# Altium footprint library cool_library.PcbLib: 1182 footprints (part 39 of 75)
Each footprint in its own frame and in the unit in brackets; x right, y up, seen from the top. Pads: shape width x height; smd on the part's side, far side on the other; paste and mask are expansions set on the pad; w line width, h text height; cw(c..) or ccw(c..) is an arc to the next point about the centre after c.
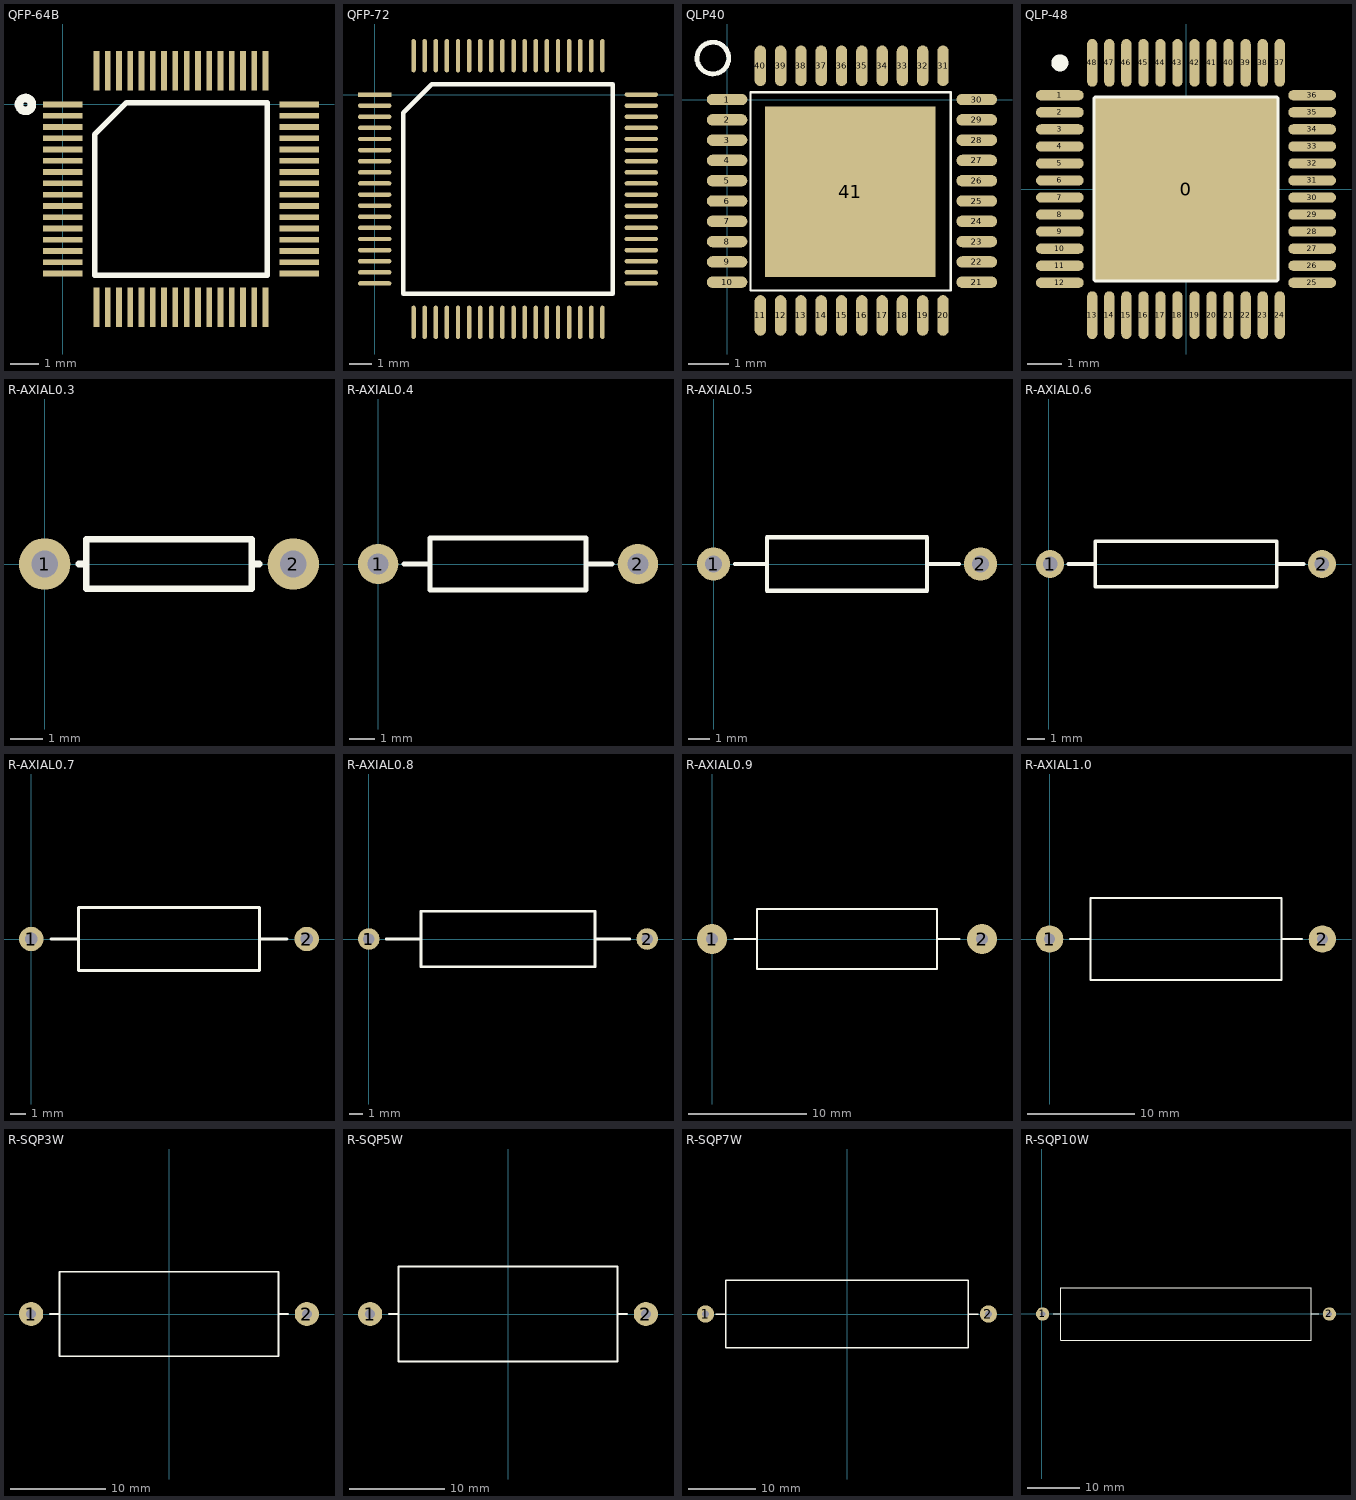
[diagram p38: the footprints below, top view; thin cyan lines are the x and y axes]

## QFP-64B [mil]
pads (64):
  rect 55x8 smd: 1(0,0) 2(0,-15.75) 3(0,-31.5) 4(0,-47.24) 5(0,-62.99) 6(0,-78.74) 7(0,-94.49) 8(0,-110.24) 9(0,-125.98) 10(0,-141.73) 11(0,-157.48) 12(0,-173.23) 13(0,-188.98) 14(0,-204.72) 15(0,-220.47) 16(0,-236.22) 33(330.71,-236.22) 34(330.71,-220.47) 35(330.71,-204.72) 36(330.71,-188.98) 37(330.71,-173.23) 38(330.71,-157.48) 39(330.71,-141.73) 40(330.71,-125.98) 41(330.71,-110.24) 42(330.71,-94.49) 43(330.71,-78.74) 44(330.71,-62.99) 45(330.71,-47.24) 46(330.71,-31.5) 47(330.71,-15.75) 48(330.71,0)
  rect 8x55 smd: 17(47.24,-283.46) 18(62.99,-283.46) 19(78.74,-283.46) 20(94.49,-283.46) 21(110.24,-283.46) 22(125.98,-283.46) 23(141.73,-283.46) 24(157.48,-283.46) 25(173.23,-283.46) 26(188.98,-283.46) 27(204.72,-283.46) 28(220.47,-283.46) 29(236.22,-283.46) 30(251.97,-283.46) 31(267.72,-283.46) 32(283.46,-283.46) 49(283.46,47.24) 50(267.72,47.24) 51(251.97,47.24) 52(236.22,47.24) 53(220.47,47.24) 54(204.72,47.24) 55(188.98,47.24) 56(173.23,47.24) 57(157.48,47.24) 58(141.73,47.24) 59(125.98,47.24) 60(110.24,47.24) 61(94.49,47.24) 62(78.74,47.24) 63(62.99,47.24) 64(47.24,47.24)
Top Overlay:
  circle w12: c-52.02,0 r9.02
  lines w7.87: 44.69,-238.78 44.69,-42.13 89.37,2.56 286.02,2.56 286.02,-238.78 44.69,-238.78

## QFP-72 [mm]
pads (72):
  rect 1.5x0.2 smd: 1(0,0)
  oval 1.5x0.2 smd: 2(0,-0.5) 3(0,-1) 4(0,-1.5) 5(0,-2) 6(0,-2.5) 7(0,-3) 8(0,-3.5) 9(0,-4) 10(0,-4.5) 11(0,-5) 12(0,-5.5) 13(0,-6) 14(0,-6.5) 15(0,-7) 16(0,-7.5) 17(0,-8) 18(0,-8.5) 37(12,-8.5) 38(12,-8) 39(12,-7.5) 40(12,-7) 41(12,-6.5) 42(12,-6) 43(12,-5.5) 44(12,-5) 45(12,-4.5) 46(12,-4) 47(12,-3.5) 48(12,-3) 49(12,-2.5) 50(12,-2) 51(12,-1.5) 52(12,-1) 53(12,-0.5) 54(12,0)
  oval 0.2x1.5 smd: 19(1.75,-10.25) 20(2.25,-10.25) 21(2.75,-10.25) 22(3.25,-10.25) 23(3.75,-10.25) 24(4.25,-10.25) 25(4.75,-10.25) 26(5.25,-10.25) 27(5.75,-10.25) 28(6.25,-10.25) 29(6.75,-10.25) 30(7.25,-10.25) 31(7.75,-10.25) 32(8.25,-10.25) 33(8.75,-10.25) 34(9.25,-10.25) 35(9.75,-10.25) 36(10.25,-10.25) 55(10.25,1.75) 56(9.75,1.75) 57(9.25,1.75) 58(8.75,1.75) 59(8.25,1.75) 60(7.75,1.75) 61(7.25,1.75) 62(6.75,1.75) 63(6.25,1.75) 64(5.75,1.75) 65(5.25,1.75) 66(4.75,1.75) 67(4.25,1.75) 68(3.75,1.75) 69(3.25,1.75) 70(2.75,1.75) 71(2.25,1.75) 72(1.75,1.75)
Top Overlay:
  lines w0.2: 1.285,-8.965 1.285,-0.82 2.57,0.465 10.715,0.465 10.715,-8.965 1.285,-8.965

## QLP40 [mm]
pads (41):
  oval 1x0.28 smd: 1(0,0) 2(0,-0.5) 3(0,-1) 4(0,-1.5) 5(0,-2) 6(0,-2.5) 7(0,-3) 8(0,-3.5) 9(0,-4) 10(0,-4.5) 21(6.15,-4.5) 22(6.15,-4) 23(6.15,-3.5) 24(6.15,-3) 25(6.15,-2.5) 26(6.15,-2) 27(6.15,-1.5) 28(6.15,-1) 29(6.15,-0.5) 30(6.15,0)
  oval 0.28x1 smd: 11(0.82,-5.32) 12(1.32,-5.32) 13(1.82,-5.32) 14(2.32,-5.32) 15(2.82,-5.32) 16(3.32,-5.32) 17(3.82,-5.32) 18(4.32,-5.32) 19(4.82,-5.32) 20(5.32,-5.32) 31(5.32,0.83) 32(4.82,0.83) 33(4.32,0.83) 34(3.82,0.83) 35(3.32,0.83) 36(2.82,0.83) 37(2.32,0.83) 38(1.82,0.83) 39(1.32,0.83) 40(0.82,0.83)
  rect 4.2x4.2 smd: 41(3.04,-2.27)
Top Overlay:
  lines w0.051: 0.58,-4.71 0.58,0.18 5.51,0.18 5.51,-4.71 0.58,-4.71
  lines w0.12: 0.04,1.009 cw(c-0.35,1.021) 0.04,1.013

## QLP-48 [mm] "QLP-48"
height 1.6
pads (49):
  rect 5.3x5.3 smd: 0(0,0)
  oval 1.4x0.3 smd: 1(-3.7,2.75) 2(-3.7,2.25) 3(-3.7,1.75) 4(-3.7,1.25) 5(-3.7,0.75) 6(-3.7,0.25) 7(-3.7,-0.25) 8(-3.7,-0.75) 9(-3.7,-1.25) 10(-3.7,-1.75) 11(-3.7,-2.25) 12(-3.7,-2.75) 25(3.7,-2.75) 26(3.7,-2.25) 27(3.7,-1.75) 28(3.7,-1.25) 29(3.7,-0.75) 30(3.7,-0.25) 31(3.7,0.25) 32(3.7,0.75) 33(3.7,1.25) 34(3.7,1.75) 35(3.7,2.25) 36(3.7,2.75)
  oval 0.3x1.4 smd: 13(-2.75,-3.7) 14(-2.25,-3.7) 15(-1.75,-3.7) 16(-1.25,-3.7) 17(-0.75,-3.7) 18(-0.25,-3.7) 19(0.25,-3.7) 20(0.75,-3.7) 21(1.25,-3.7) 22(1.75,-3.7) 23(2.25,-3.7) 24(2.75,-3.7) 37(2.75,3.7) 38(2.25,3.7) 39(1.75,3.7) 40(1.25,3.7) 41(0.75,3.7) 42(0.25,3.7) 43(-0.25,3.7) 44(-0.75,3.7) 45(-1.25,3.7) 46(-1.75,3.7) 47(-2.25,3.7) 48(-2.75,3.7)
Top Overlay:
  circle w0.25: c-3.7,3.7 r0.125
  lines w0.2: -2.65,-2.65 2.65,-2.65 2.65,2.65 -2.65,2.65 -2.65,-2.65

## R-AXIAL0.3 [mil]
pads (2):
  round 62 hole 32: 1(0,0) 2(300,0)
Top Overlay:
  lines w8: 41,0 50,0 ; 259,0 250,0 ; 250,0 250,30 50,30 50,-30 250,-30 250,0

## R-AXIAL0.4 [mil]
pads (2):
  round 62 hole 32: 1(0,0) 2(400,0)
Top Overlay:
  lines w8: 40,0 80,0 ; 320,0 360,0 ; 80,-40 80,40 320,40 320,-40 80,-40

## R-AXIAL0.5 [mil]
pads (2):
  round 62 hole 32: 1(0,0) 2(500,0)
Top Overlay:
  lines w8: 40,0 100,0 ; 400,0 460,0 ; 100,-50 100,50 400,50 400,-50 100,-50

## R-AXIAL0.6 [mil]
pads (2):
  round 62 hole 32: 1(2.5,0) 2(602.5,0)
Top Overlay:
  lines w8: 42.5,0 102.5,0 ; 502.5,0 562.5,0 ; 102.5,-50 502.5,-50 502.5,50 102.5,50 102.5,-50

## R-AXIAL0.7 [mil]
pads (2):
  round 62 hole 32: 1(0,0) 2(700,0)
Top Overlay:
  lines w8: 50,0 120,0 ; 580,0 650,0 ; 120,-80 120,80 580,80 580,-80 120,-80

## R-AXIAL0.8 [mil]
pads (2):
  round 62 hole 32: 1(0,0) 2(800,0)
Top Overlay:
  lines w8: 50,0 150,0 ; 650,0 750,0 ; 150,-80 150,80 650,80 650,-80 150,-80

## R-AXIAL0.9 [mil]
pads (2):
  round 100 hole 40: 1(0,0) 2(900,0)
Top Overlay:
  lines w8: 75,0 150,0 ; 750,0 825,0 ; 150,-100 150,100 750,100 750,-100 150,-100

## R-AXIAL1.0 [mil]
pads (2):
  round 100 hole 40: 1(0,0) 2(1000,0)
Top Overlay:
  lines w8: 75,0 150,0 ; 850,0 925,0 ; 150,-150 850,-150 850,150 150,150 150,-150

## R-SQP3W [mm]
pads (2):
  round 2.54 hole 1.016: 1(-14.5,0) 2(14.5,0)
Top Overlay:
  lines w0.203: -12.5,0 -11.5,0 ; 11.5,0 12.5,0 ; -11.5,-4.445 -11.5,4.445 11.5,4.445 11.5,-4.445 -11.5,-4.445

## R-SQP5W [mm]
pads (2):
  round 2.54 hole 1.016: 1(-14.5,0) 2(14.5,0)
Top Overlay:
  lines w0.203: -12.5,0 -11.5,0 ; 11.5,0 12.5,0 ; -11.5,-5 -11.5,5 11.5,5 11.5,-5 -11.5,-5

## R-SQP7W [mm]
pads (2):
  round 2.54 hole 1.016: 1(-21,0) 2(21,0)
Top Overlay:
  lines w0.203: -19.5,0 -18,0 ; 18,0 19.5,0 ; -18,-5 18,-5 18,5 -18,5 -18,-5

## R-SQP10W [mil]
pads (2):
  round 100 hole 40: 1(4.82,-2.5) 2(2170.18,-2.5)
Top Overlay:
  lines w8: 83.56,-2.5 142.62,-2.5 ; 2032.38,-2.5 2091.44,-2.5 ; 142.62,-199.35 2032.38,-199.35 2032.38,194.35 142.62,194.35 142.62,-199.35